# Altium footprint library Horizont_11_12_2017.PcbLib: 257 footprints (part 17 of 17)
Each footprint in its own frame and in the unit in brackets; x right, y up, seen from the top. Pads: shape width x height; smd on the part's side, far side on the other; paste and mask are expansions set on the pad; w line width, h text height; cw(c..) or ccw(c..) is an arc to the next point about the centre after c.
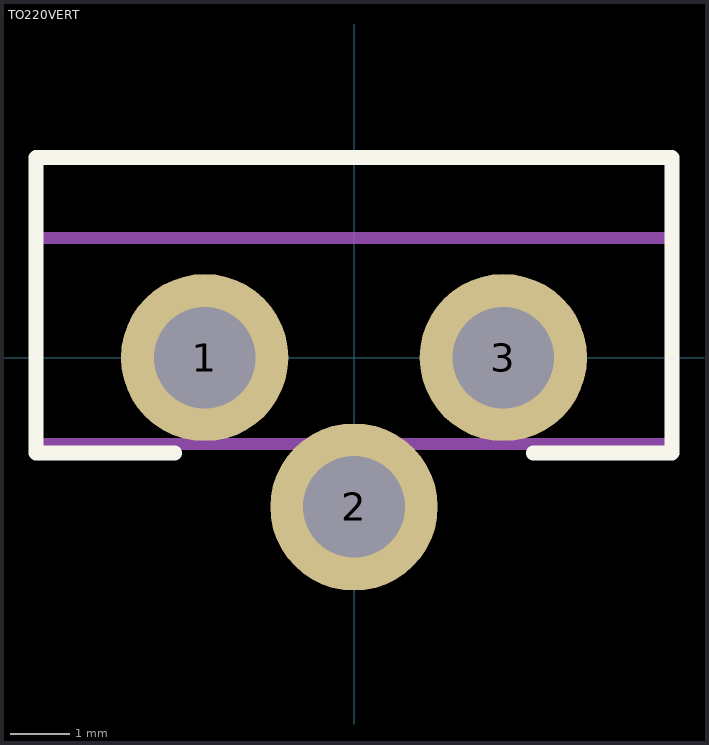
[diagram p16: the footprint, top view; thin cyan lines are the x and y axes]

## ТО220VERT [mm]
height 21
pads (3):
  round 2.8 hole 1.7: 1(-2.5,0) 2(0,-2.5) 3(2.5,0)
Top Overlay:
  lines w0.25: -3,-1.6 -5.325,-1.6 -5.325,3.35 5.325,3.35 5.325,-1.6 3,-1.6
Mechanical 1:
  lines w0.2: -5.325,2 5.325,2 ; 0,-2.5 0,-1.45 ; -5.325,-1.45 -5.325,3.35 5.325,3.35 5.325,-1.45 -5.325,-1.45
  text "2" at -0.46,-0.682 h1.5
  text "3" at 3.482,-0.017 h1.5
  text "1" at -4.27,-0.017 h1.5
  text ".Designator" at -1.38,4.05 h1.5
3D body "КТ-28_Vertical.STEP": height 21.6, standoff -3, extent -5.325,-3.05 5.325,3.35